# Altium footprint library Hydrolib_pcb.PcbLib: 102 footprints (part 7 of 7)
Each footprint in its own frame and in the unit in brackets; x right, y up, seen from the top. Pads: shape width x height; smd on the part's side, far side on the other; paste and mask are expansions set on the pad; w line width, h text height; cw(c..) or ccw(c..) is an arc to the next point about the centre after c.
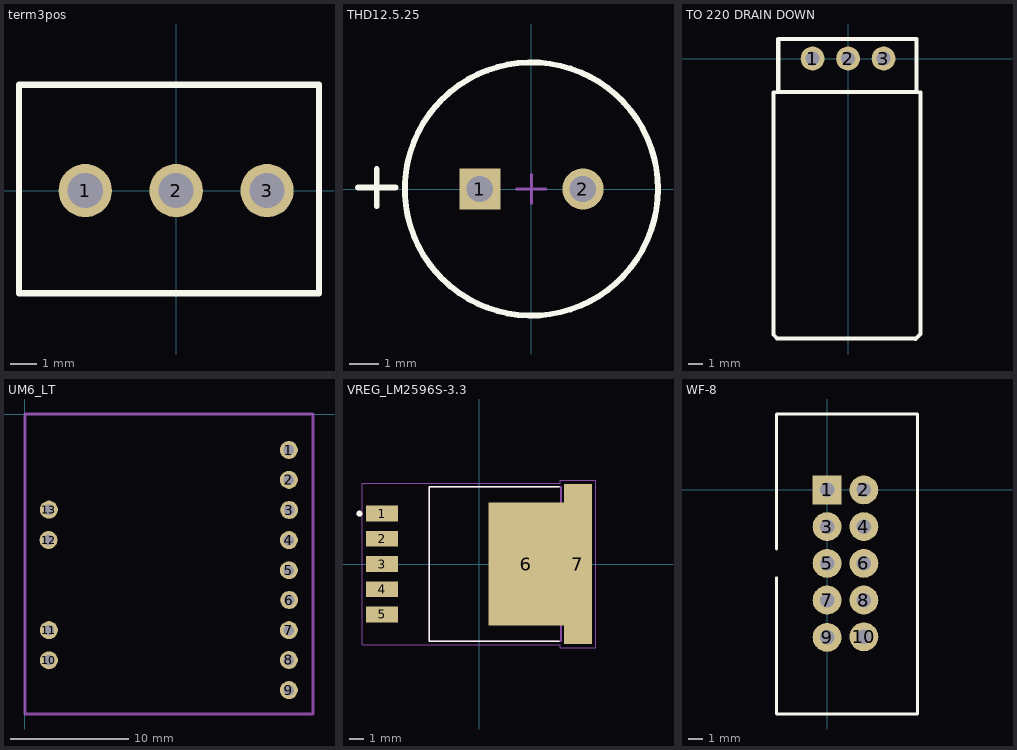
[diagram p6: the footprints below, top view; thin cyan lines are the x and y axes]

## term3pos [mm]
pads (3):
  round 2.05 hole 1.35: 1(-3.5,0) 2(0,0) 3(3.5,0)
Top Overlay:
  lines w0.25: -6.05,-3.95 5.5,-3.95 5.5,4.075 -6.05,4.075 -6.05,-3.95
3D body "691214110003.stp": height 8.5, standoff -3.7, extent -5.675,-3.7 5.275,3.7

## THD12.5.25 [mm] "THD, 2-Leads, Dia 12.5mm, Body 25mm"
height 25
pads (2):
  rect 1.4x1.4 hole 0.9: 1(-1.75,0)
  round 1.4 hole 0.9: 2(1.75,0)
Top Overlay:
  circle w0.2: c0,0 r4.3
  lines w0.2: -5.89,0.05 -4.62,0.05 ; -5.255,-0.585 -5.255,0.685
Mechanical 15:
  lines w0.1: -0.5,0 0.5,0 ; 0,-0.5 0,0.5

## TO 220 DRAIN DOWN [mm]
pads (3):
  round 1.7 hole 1: 1(-2.54,0) 2(0,0) 3(2.54,0)
Top Overlay:
  lines w0.254: -5.076,-20.028 -5.334,-19.77 -5.334,-2.413 5.182,-2.413 5.182,-19.708 4.824,-20.066 ; -4.873,1.397 4.9,1.397
  lines w0.3: -5.076,-20.028 4.824,-20.028 ; -5,-2.4 4.9,-2.4 4.9,1.397 -5,1.397 -5,-2.4
3D body "MOSFET_FLIP.STEP": height 6.88, standoff -4.59, extent -5.27,-19.745 5.27,0.555

## UM6_LT [mil]
pads (13):
  round 60 hole 35.43: 1(879.92,-120) 2(879.92,-219.49) 3(880.91,-320) 4(880,-420.28) 5(880,-520.67) 6(880.91,-620) 7(879.92,-720.47) 8(880,-819.88) 9(879.92,-920.28) 10(80,-820.87) 11(80,-720.47) 12(78.74,-420) 13(80,-318.9)
Template:
  lines w10: 960,-1000 0,-1000 0,0 960,0 960.63,-1000
Pattern top:
  text "String" at 192.91,59.06 h83.86
3D body "Сборка_2.STEP": height 472.44, standoff -15.75, extent -0.01,-1000 959.84,0

## VREG_LM2596S-3.3 [mm]
height 4.65
pads (7):
  rect 2.16x1.07 smd: 1(-6.545,3.4) 2(-6.545,1.7) 3(-6.545,0) 4(-6.545,-1.7) 5(-6.545,-3.4)
  rect 5.08x8.33 smd paste-5: 6(3.175,0)
  rect 1.91x10.8 smd paste-6: 7(6.67,0)
Top Overlay:
  circle w0.2: c-8.075,3.4 r0.1
  lines w0.127: 5.402,-5.21 -3.37,-5.21 -3.37,5.21 5.402,5.21
Top Paste:
  region: 7.255,-3.93 5.665,-3.93 5.665,-2.71 7.255,-2.71
  region: 7.255,-2.27 5.665,-2.27 5.665,-1.05 7.255,-1.05
  region: 4.925,-3.93 3.335,-3.93 3.335,-2.71 4.925,-2.71
  region: 4.925,-2.27 3.335,-2.27 3.335,-1.05 4.925,-1.05
  region: 2.595,-3.93 1.005,-3.93 1.005,-2.71 2.595,-2.71
  region: 2.595,-2.27 1.005,-2.27 1.005,-1.05 2.595,-1.05
  region: 7.255,2.71 5.665,2.71 5.665,3.93 7.255,3.93
  region: 7.255,1.05 5.665,1.05 5.665,2.27 7.255,2.27
  region: 4.925,2.71 3.335,2.71 3.335,3.93 4.925,3.93
  region: 4.925,1.05 3.335,1.05 3.335,2.27 4.925,2.27
  region: 2.595,2.71 1.005,2.71 1.005,3.93 2.595,3.93
  region: 2.595,1.05 1.005,1.05 1.005,2.27 2.595,2.27
  region: 7.255,-0.61 5.665,-0.61 5.665,0.61 7.255,0.61
  region: 2.595,-0.61 1.005,-0.61 1.005,0.61 2.595,0.61
  region: 4.925,-0.61 3.335,-0.61 3.335,0.61 4.925,0.61
Mechanical 13:
  circle w0.2: c-8.075,3.4 r0.1
  lines w0.127: -3.37,-5.21 5.53,-5.21 5.53,5.21 -3.37,5.21 -3.37,-5.21
Mechanical 15:
  lines w0.05: -7.88,-5.46 5.465,-5.46 5.465,-5.65 7.88,-5.65 7.88,5.65 5.465,5.65 5.465,5.46 -7.88,5.46 -7.88,-5.46
3D body "step_temp.STEP": height 4.65, standoff -0.15, extent -7.175,-5.08 7.175,5.08

## WF-8 [mm] "IDC-10 Male Connector"
height 9
pads (10):
  rect 2x2 hole 1: 1(0,0)
  round 2 hole 1: 2(2.54,0) 3(0,-2.54) 4(2.54,-2.54) 5(0,-5.08) 6(2.54,-5.08) 7(0,-7.62) 8(2.54,-7.62) 9(0,-10.2) 10(2.54,-10.16)
Top Overlay:
  lines w0.2: -3.5,-6.075 -3.5,-15.5 6.25,-15.5 6.25,5.25 -3.5,5.25 -3.5,-4.075
3D body "User Library-BH-10__64BH-10.STEP": height 9.1, standoff -3, extent -3.83,-15.325 5.47,5.175